# Altium footprint library etherceptor.PcbLib: 98 footprints (part 2 of 7)
Each footprint in its own frame and in the unit in brackets; x right, y up, seen from the top. Pads: shape width x height; smd on the part's side, far side on the other; paste and mask are expansions set on the pad; w line width, h text height; cw(c..) or ccw(c..) is an arc to the next point about the centre after c.
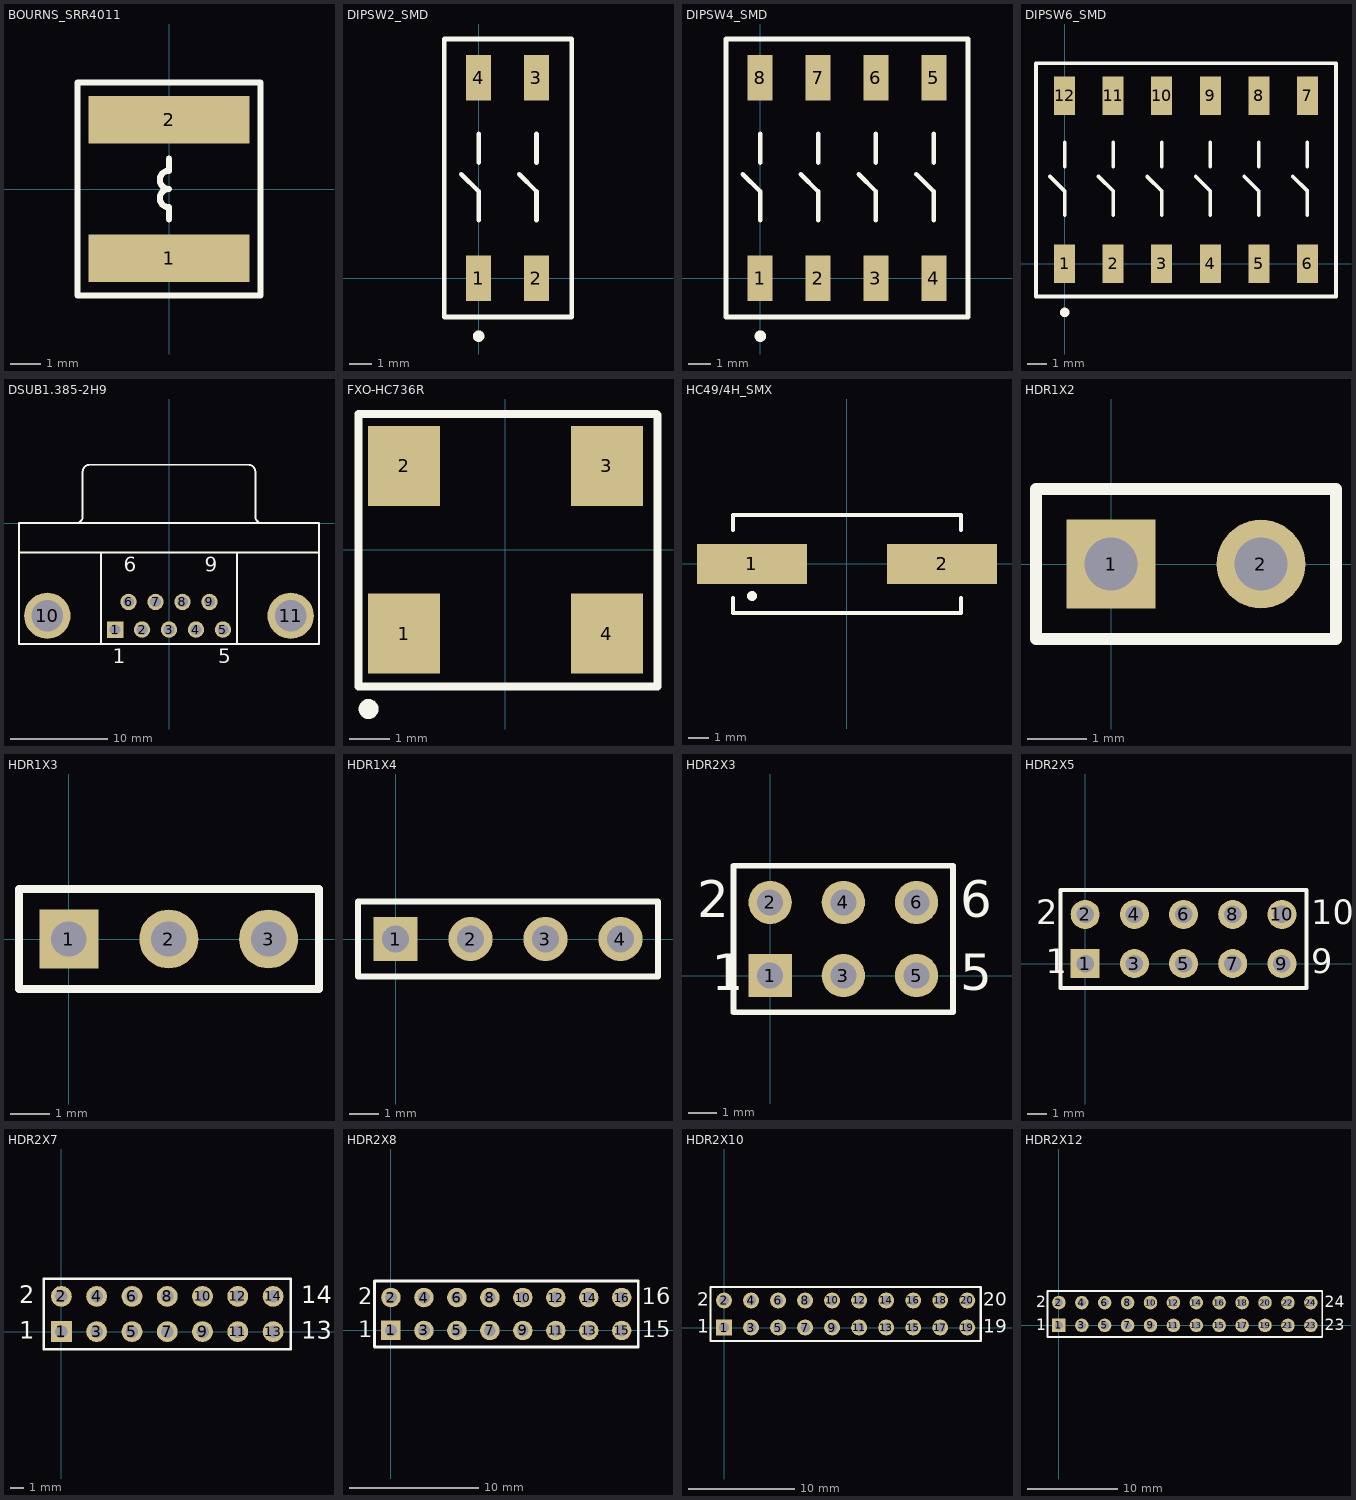
[diagram p1: the footprints below, top view; thin cyan lines are the x and y axes]

## BOURNS_SRR4011 [mm] "Bourns SRR4011 Inductor"
pads (2):
  rect 5.3x1.55 smd: 1(0,-2.275) 2(0,2.275)
Top Overlay:
  lines w0.2: 0,-1 0,-0.6 cw(c0,-0.3) 0,0 cw(c0,0.3) 0,0.6 0,1 ; -3,-3.5 -3,3.5 3,3.5 3,-3.5 -3,-3.5
3D body "User Library-LPS5015.STEP": height 1.4, standoff 0, extent -2.4,-2.4 2.4,2.4

## DIPSW2_SMD [mm]
pads (4):
  rect 1.1x2 smd: 1(0,0) 2(2.54,0) 3(2.54,8.8) 4(0,8.8)
Top Overlay:
  circle w0.25: c0.002,-2.54 r0.125
  lines w0.2: -0.762,4.572 0,3.81 0,2.54 ; 0,5.08 0,6.35 ; 1.778,4.572 2.54,3.81 2.54,2.54 ; 2.54,5.08 2.54,6.35 ; -1.5,-1.7 4.08,-1.7 4.08,10.5 -1.5,10.5 -1.5,-1.7
3D body "DIP2_SMD.STEP": height 3.7, standoff 0, extent -1.44,-0.48 4.08,9.22

## DIPSW4_SMD [mm]
pads (8):
  rect 1.1x2 smd: 1(0,0) 2(2.54,0) 3(5.08,0) 4(7.62,0) 5(7.62,8.8) 6(5.08,8.8) 7(2.54,8.8) 8(0,8.8)
Top Overlay:
  circle w0.25: c0.002,-2.54 r0.125
  lines w0.2: -0.762,4.572 0,3.81 0,2.54 ; 0,5.08 0,6.35 ; 1.778,4.572 2.54,3.81 2.54,2.54 ; 2.54,5.08 2.54,6.35 ; 4.318,4.572 5.08,3.81 5.08,2.54 ; 5.08,5.08 5.08,6.35 ; 6.858,4.572 7.62,3.81 7.62,2.54 ; 7.62,5.08 7.62,6.35 ; 9.1,-1.7 -1.5,-1.7 -1.5,10.5 9.1,10.5 ; 9.12,-1.7 9.12,10.5
3D body "SW3dPS-DIP-Schalter SMD 4polig RM2,54.STEP": height 4.19, standoff -0.01, extent -1.28,0.55 8.88,8.17

## DIPSW6_SMD [mm]
pads (12):
  rect 1.1x2 smd: 1(0,0) 2(2.54,0) 3(5.08,0) 4(7.62,0) 5(10.16,0) 6(12.7,0) 7(12.7,8.8) 8(10.16,8.8) 9(7.62,8.8) 10(5.08,8.8) 11(2.54,8.8) 12(0,8.8)
Top Overlay:
  circle w0.25: c0.002,-2.54 r0.125
  lines w0.2: -0.762,4.572 0,3.81 0,2.54 ; 0,5.08 0,6.35 ; 1.778,4.572 2.54,3.81 2.54,2.54 ; 2.54,5.08 2.54,6.35 ; 4.318,4.572 5.08,3.81 5.08,2.54 ; 5.08,5.08 5.08,6.35 ; 6.858,4.572 7.62,3.81 7.62,2.54 ; 7.62,5.08 7.62,6.35 ; 9.398,4.572 10.16,3.81 10.16,2.54 ; 10.16,5.08 10.16,6.35 ; 11.938,4.572 12.7,3.81 12.7,2.54 ; 12.7,5.08 12.7,6.35 ; -1.5,-1.7 -1.5,10.5 14.2,10.5 14.2,-1.7 -1.5,-1.7
3D body "SW3dPS-DIP-Schalter SMD 6polig RM2,54.STEP": height 4.19, standoff -0.01, extent -1.27,0.8 13.97,8.42

## DSUB1.385-2H9 [mm] "Connector; D Subminiature; 9 Position; Right Angle; Pitch 1.385 mm"
height 12.75
pads (11):
  rect 1.69x1.69 hole 1.09: 1(-5.54,-10.92)
  round 1.69 hole 1.09: 2(-2.77,-10.92) 3(0,-10.92) 4(2.77,-10.92) 5(5.54,-10.92) 6(-4.155,-8.08) 7(-1.385,-8.08) 8(1.385,-8.08) 9(4.155,-8.08)
  round 4.76 hole 3.26: 10(-12.495,-9.5) 11(12.495,-9.5)
Top Overlay:
  lines w0.2: -15.4,-3 15.4,-3 ; -9.56,0.005 ccw(c-9.56,0.7) -8.865,0.7 -8.865,5.3 ; -8.86,5.305 cw(c-8.165,5.305) -8.165,6 8.165,6 cw(c8.165,5.305) 8.86,5.305 ; -7,-12.4 -7,-3 ; 7,-12.4 7,-3 ; 8.865,5.3 8.865,0.7 ccw(c9.56,0.7) 9.56,0.005 ; -15.4,-12.4 -15.4,0 15.4,0 15.4,-12.4 -15.4,-12.4
  text "1" at -5.79,-14.375 h1.5
  text "5" at 5.04,-14.375 h1.5
  text "9" at 3.655,-4.975 h1.5
  text "6" at -4.655,-4.975 h1.5
3D body "SW3dPS-dsub.STEP": height 12.5, standoff -4.1, extent -15.668,-12.65 15.568,7.95

## FXO-HC736R [mm] "Quartz Crystal, SM; Body 7.5 x 5.1 mm (LxW max)"
height 1.8
pads (4):
  rect 1.8x2 smd: 1(-2.54,-2.1) 2(-2.54,2.1) 3(2.54,2.1) 4(2.54,-2.1)
Top Overlay:
  circle w0.25: c-3.427,-3.988 r0.125
  lines w0.2: -3.683,-3.429 -3.683,3.4 3.788,3.4 3.81,3.378 3.81,-3.429 -3.683,-3.429
3D body "SW3dPS-FXO-HC73.STEP": height 1.4, standoff -0.01, extent -3.7,-2.6 3.8,2.62

## HC49/4H_SMX [mm] "Quartz Crystal, SM; Body 13.4 (inc. leads) x 4.9 mm (LxW max)"
height 4.3
pads (2):
  rect 5.5x2 smd: 1(-4.75,0) 2(4.75,0)
Top Overlay:
  circle w0.25: c-4.75,-1.6 r0.125
  lines w0.2: -5.7,-1.7 -5.7,-2.45 5.7,-2.45 5.7,-1.7 ; -5.7,1.7 -5.7,2.45 5.7,2.45 5.7,1.7
3D body "SW3dPS-hc49_cystal.STEP": height 5.08, standoff 0, extent -6.7,-2.45 6.7,2.45

## HDR1X2 [mm] "Connector; Header; 2 Position"
pads (2):
  rect 1.5x1.5 hole 0.9: 1(0,0)
  round 1.5 hole 0.9: 2(2.54,0)
Top Overlay:
  lines w0.2: -1.27,-1.27 -1.27,1.27 3.81,1.27 3.81,-1.27 -1.27,-1.27
3D body "User Library-Header1x2.STEP": height 8.54, standoff -2.44, extent -1.29,-1.25 3.79,1.29

## HDR1X3 [mm] "Connector; Header; 4 Position"
pads (3):
  rect 1.5x1.5 hole 0.9: 1(0,0)
  round 1.5 hole 0.9: 2(2.54,0) 3(5.08,0)
Top Overlay:
  lines w0.2: -1.27,-1.27 -1.27,1.27 6.36,1.27 6.36,-1.27 -1.27,-1.27
3D body "User Library-Header_Male_3Pin.STEP": height 8.54, standoff -3, extent -1.27,-1.245 6.35,1.245

## HDR1X4 [mm] "Connector; Header; 4 Position"
pads (4):
  rect 1.5x1.5 hole 0.9: 1(0,0)
  round 1.5 hole 0.9: 2(2.54,0) 3(5.08,0) 4(7.62,0)
Top Overlay:
  lines w0.2: -1.27,-1.27 -1.27,1.27 8.89,1.27 8.89,-1.27 -1.27,-1.27

## HDR2X3 [mm] "Connector; Header; 3x2 Position"
pads (6):
  rect 1.5x1.5 hole 0.9: 1(0,0)
  round 1.5 hole 0.9: 2(0,2.54) 3(2.54,0) 4(2.54,2.54) 5(5.08,0) 6(5.08,2.54)
Top Overlay:
  lines w0.2: 1.482,-1.27 6.35,-1.27 ; 6.35,-1.27 6.35,3.81 -1.27,3.81 -1.27,-1.27 6.35,-1.27
  text "6" at 6.604,2.032 h1.27
  text "5" at 6.604,-0.508 h1.27
  text "2" at -2.54,2.032 h1.27
  text "1" at -2.032,-0.508 h1.27
3D body "User Library-Header-2x3.STEP": height 8.4, standoff -3, extent -1.22,-1.25 6.4,3.75

## HDR2X5 [mm] "Connector; Header; 5x2 Position"
pads (10):
  rect 1.5x1.5 hole 0.9: 1(0,0)
  round 1.5 hole 0.9: 2(0,2.54) 3(2.54,0) 4(2.54,2.54) 5(5.08,0) 6(5.08,2.54) 7(7.62,0) 8(7.62,2.54) 9(10.16,0) 10(10.16,2.54)
Top Overlay:
  lines w0.2: -1.27,-1.27 -1.27,3.81 11.43,3.81 11.43,-1.27 -1.27,-1.27
  text "2" at -2.54,2.032 h1.27
  text "1" at -2.032,-0.508 h1.27
  text "9" at 11.684,-0.508 h1.27
  text "10" at 11.684,2.032 h1.27
3D body "User Library-Header-2x5.STEP": height 8.4, standoff -3, extent -1.27,-1.3 11.43,3.7

## HDR2X7 [mm] "Connector; Header; 7x2 Position"
pads (14):
  rect 1.5x1.5 hole 0.9: 1(0,0)
  round 1.5 hole 0.9: 2(0,2.54) 3(2.54,0) 4(2.54,2.54) 5(5.08,0) 6(5.08,2.54) 7(7.62,0) 8(7.62,2.54) 9(10.16,0) 10(10.16,2.54) 11(12.7,0) 12(12.7,2.54) 13(15.24,0) 14(15.24,2.54)
Top Overlay:
  lines w0.2: -1.27,-1.27 -1.27,3.81 16.51,3.81 16.51,-1.27 -1.27,-1.27
  text "2" at -3.048,2.032 h1.27
  text "1" at -3.048,-0.508 h1.27
  text "14" at 17.272,2.032 h1.27
  text "13" at 17.272,-0.508 h1.27
3D body "User Library-Header-2x7.STEP": height 8.4, standoff -3, extent -1.29,-1.25 16.49,3.75

## HDR2X8 [mm] "Connector; Header; 8x2 Position"
pads (16):
  rect 1.5x1.5 hole 0.9: 1(0,0)
  round 1.5 hole 0.9: 2(0,2.54) 3(2.54,0) 4(2.54,2.54) 5(5.08,0) 6(5.08,2.54) 7(7.62,0) 8(7.62,2.54) 9(10.16,0) 10(10.16,2.54) 11(12.7,0) 12(12.7,2.54) 13(15.24,0) 14(15.24,2.54) 15(17.78,0) 16(17.78,2.54)
Top Overlay:
  lines w0.2: -1.27,-1.27 19.05,-1.27 19.05,3.81 -1.27,3.81 -1.27,-1.27
  text "16" at 19.304,2.032 h1.27
  text "15" at 19.304,-0.508 h1.27
  text "1" at -2.54,-0.508 h1.27
  text "2" at -2.54,2.032 h1.27
3D body "User Library-Header-2x8.STEP": height 8.4, standoff -3, extent -1.32,-1.25 19,3.75

## HDR2X10 [mm] "Connector; Header; 10x2 Position"
pads (20):
  rect 1.5x1.5 hole 0.9: 1(0,0)
  round 1.5 hole 0.9: 2(0,2.54) 3(2.54,0) 4(2.54,2.54) 5(5.08,0) 6(5.08,2.54) 7(7.62,0) 8(7.62,2.54) 9(10.16,0) 10(10.16,2.54) 11(12.7,0) 12(12.7,2.54) 13(15.24,0) 14(15.24,2.54) 15(17.78,0) 16(17.78,2.54) 17(20.32,0) 18(20.32,2.54) 19(22.86,0) 20(22.86,2.54)
Top Overlay:
  lines w0.2: -1.27,-1.27 0.635,-1.27 24.13,-1.27 24.13,3.81 0.635,3.81 -1.27,3.81 -1.27,-1.27
  text "20" at 24.384,2.032 h1.27
  text "19" at 24.384,-0.508 h1.27
  text "1" at -2.54,-0.508 h1.27
  text "2" at -2.54,2.032 h1.27

## HDR2X12 [mm] "Connector; Header; 12x2 Position"
pads (24):
  rect 1.5x1.5 hole 0.9: 1(0,0)
  round 1.5 hole 0.9: 2(0,2.54) 3(2.54,0) 4(2.54,2.54) 5(5.08,0) 6(5.08,2.54) 7(7.62,0) 8(7.62,2.54) 9(10.16,0) 10(10.16,2.54) 11(12.7,0) 12(12.7,2.54) 13(15.24,0) 14(15.24,2.54) 15(17.78,0) 16(17.78,2.54) 17(20.32,0) 18(20.32,2.54) 19(22.86,0) 20(22.86,2.54) 21(25.4,0) 22(25.4,2.54) 23(27.94,0) 24(27.94,2.54)
Top Overlay:
  lines w0.2: -1.27,-1.27 29.21,-1.27 29.21,3.81 -1.27,3.81 -1.27,-1.27
  text "24" at 29.464,2.032 h1.27
  text "23" at 29.464,-0.508 h1.27
  text "2" at -2.54,2.032 h1.27
  text "1" at -2.54,-0.508 h1.27
3D body "User Library-Header-2x12.STEP": height 8.4, standoff -3, extent -1.3,-1.3 29.18,3.7